# Altium footprint library communication_modules.PcbLib: 12 footprints
Each footprint in its own frame and in the unit in brackets; x right, y up, seen from the top. Pads: shape width x height; smd on the part's side, far side on the other; paste and mask are expansions set on the pad; w line width, h text height; cw(c..) or ccw(c..) is an arc to the next point about the centre after c.
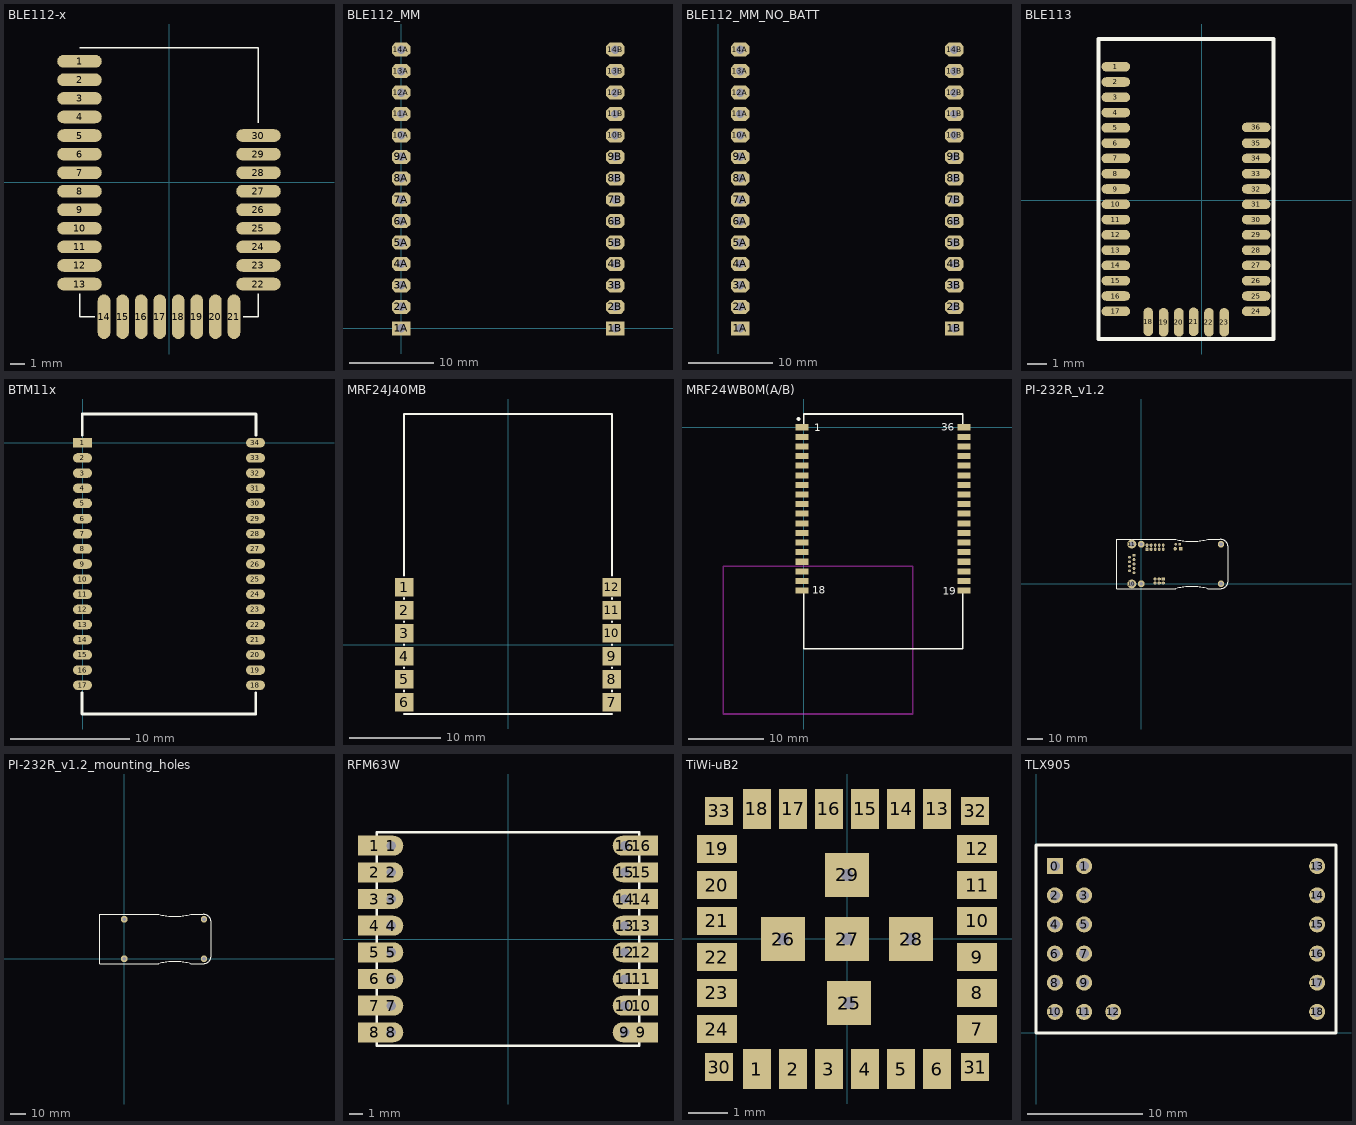
[diagram p0: the footprints below, top view; thin cyan lines are the x and y axes]

## BLE112-x [mm] "Bluegiga BLE112 Bluetooth Low Energy Single Mode Module"
height 2.3
pads (30):
  oval 3x0.85 smd mask+0.05: 1(-6.025,8.15) 2(-6.025,6.9) 3(-6.025,5.65) 4(-6.025,4.4) 5(-6.025,3.15) 6(-6.025,1.9) 7(-6.025,0.65) 8(-6.025,-0.6) 9(-6.025,-1.85) 10(-6.025,-3.1) 11(-6.025,-4.35) 12(-6.025,-5.6) 13(-6.025,-6.85) 22(6.025,-6.85) 23(6.025,-5.6) 24(6.025,-4.35) 25(6.025,-3.1) 26(6.025,-1.85) 27(6.025,-0.6) 28(6.025,0.65) 29(6.025,1.9) 30(6.025,3.15)
  oval 0.85x3 smd mask+0.05: 14(-4.375,-9.05) 15(-3.125,-9.05) 16(-1.875,-9.05) 17(-0.625,-9.05) 18(0.625,-9.05) 19(1.875,-9.05) 20(3.125,-9.05) 21(4.375,-9.05)
Top Overlay:
  lines w0.1: -6.025,-7.5 -6.025,-9.05 -5,-9.05 ; -6.025,9.05 6.025,9.05 6.025,4 ; 5,-9.05 6.025,-9.05 6.025,-7.5
3D body "User Library-BLE112.step": height 2.3, standoff 0, extent -6.025,-9.05 6.025,9.05

## BLE112_MM [mm]
pads (28):
  rect 2.2x1.66 hole 1: 1A(0,0) 1B(25.4,0)
  oct 2.2x1.66 hole 1: 2A(0,2.54) 2B(25.4,2.54) 3A(0,5.08) 3B(25.4,5.08) 4A(0,7.62) 4B(25.4,7.62) 5A(0,10.16) 5B(25.4,10.16) 6A(0,12.7) 6B(25.4,12.7) 7A(0,15.24) 7B(25.4,15.24) 8A(0,17.78) 8B(25.4,17.78) 9A(0,20.32) 9B(25.4,20.32) 10A(0,22.86) 10B(25.4,22.86) 11A(0,25.4) 11B(25.4,25.4) 12A(0,27.94) 12B(25.4,27.94) 13A(0,30.48) 13B(25.4,30.48) 14A(0,33.02) 14B(25.4,33.02)
Bottom Overlay:
  lines w0.254: -1.27,1.27 1.2,1.27 ; 24.13,1.27 26.6,1.27 ; -1.27,-1.27 -1.27,34.29 1.2,34.29 1.2,-1.27 -1.27,-1.27 ; 24.13,-1.27 24.13,34.29 26.6,34.29 26.6,-1.27 24.13,-1.27
3D body "BLE112_Module.step": height 12, standoff -1.79, extent -2.61,-3.182 27.87,35.56

## BLE112_MM_NO_BATT [mm]
pads (28):
  rect 2.2x1.66 hole 1: 1A(2.6,3.175) 1B(28,3.175)
  oct 2.2x1.66 hole 1: 2A(2.6,5.715) 2B(28,5.715) 3A(2.6,8.255) 3B(28,8.255) 4A(2.6,10.795) 4B(28,10.795) 5A(2.6,13.335) 5B(28,13.335) 6A(2.6,15.875) 6B(28,15.875) 7A(2.6,18.415) 7B(28,18.415) 8A(2.6,20.955) 8B(28,20.955) 9A(2.6,23.495) 9B(28,23.495) 10A(2.6,26.035) 10B(28,26.035) 11A(2.6,28.575) 11B(28,28.575) 12A(2.6,31.115) 12B(28,31.115) 13A(2.6,33.655) 13B(28,33.655) 14A(2.6,36.195) 14B(28,36.195)
Bottom Overlay:
  lines w0.254: 1.33,4.445 3.8,4.445 ; 26.73,4.445 29.2,4.445 ; 1.33,1.905 3.8,1.905 3.8,37.465 1.33,37.465 1.33,1.905 ; 26.73,1.905 29.2,1.905 29.2,37.465 26.73,37.465 26.73,1.905
3D body "BLE112_Module(No Battery).step": height 12, standoff -1.79, extent 0,0 30.48,38.742

## BLE113 [mm]
pads (36):
  oval 1.5x0.5 smd: 1(-4.5,7) 2(-4.5,6.2) 3(-4.5,5.4) 4(-4.5,4.6) 5(-4.5,3.8) 6(-4.5,3) 7(-4.5,2.2) 8(-4.5,1.4) 9(-4.5,0.6) 10(-4.5,-0.2) 11(-4.5,-1) 12(-4.5,-1.8) 13(-4.5,-2.6) 14(-4.5,-3.4) 15(-4.5,-4.2) 16(-4.5,-5) 17(-4.5,-5.8) 24(2.85,-5.8) 25(2.85,-5) 26(2.85,-4.2) 27(2.85,-3.4) 28(2.85,-2.6) 29(2.85,-1.8) 30(2.85,-1) 31(2.85,-0.2) 32(2.85,0.6) 33(2.85,1.4) 34(2.85,2.2) 35(2.85,3) 36(2.85,3.825)
  oval 0.5x1.5 smd: 18(-2.8,-6.35) 19(-2,-6.375) 20(-1.2,-6.375) 21(-0.425,-6.35) 22(0.375,-6.375) 23(1.175,-6.375)
Top Overlay:
  lines w0.2: -5.4,-7.25 -5.4,8.45 3.75,8.45 3.75,-7.25 -5.4,-7.25
3D body "User Library-BLE113.step": height 1.9, standoff -0.01, extent -5.4,-7.263 3.75,8.462

## BTM11x [mm] "Bluetooth Class 2 BC04-ext Module"
height 2.2
pads (34):
  rect 1.6x0.8 smd: 1(0,0)
  oval 1.6x0.8 smd: 2(0,-1.27) 3(0,-2.54) 4(0,-3.81) 5(0,-5.08) 6(0,-6.35) 7(0,-7.62) 8(0,-8.89) 9(0,-10.16) 10(0,-11.43) 11(0,-12.7) 12(0,-13.97) 13(0,-15.24) 14(0,-16.51) 15(0,-17.78) 16(0,-19.05) 17(0,-20.32) 18(14.5,-20.32) 19(14.5,-19.05) 20(14.5,-17.78) 21(14.5,-16.51) 22(14.5,-15.24) 23(14.5,-13.97) 24(14.5,-12.7) 25(14.5,-11.43) 26(14.5,-10.16) 27(14.5,-8.89) 28(14.5,-7.62) 29(14.5,-6.35) 30(14.5,-5.08) 31(14.5,-3.81) 32(14.5,-2.54) 33(14.5,-1.27) 34(14.5,0)
Top Overlay:
  lines w0.229: -0.051,-20.955 -0.051,-22.733 14.529,-22.733 14.529,-20.955 ; -0.029,0.635 -0.029,2.413 14.551,2.413 14.551,0.635
3D body: height 2.2, standoff 0, extent 0,-22.682 14.478,2.337

## MRF24J40MB [mil]
pads (12):
  rect 80x80 smd: 1(-450,250) 2(-450,150) 3(-450,50) 4(-450,-50) 5(-450,-150) 6(-450,-250) 7(450,-250) 8(450,-150) 9(450,-50) 10(450,50) 11(450,150) 12(450,250)
Top Overlay:
  lines w7.87: -450,-300 450,-300 ; -450,-202 -450,-198 ; -450,-102 -450,-98 ; -450,-2 -450,2 ; -450,98 -450,102 ; -450,198 -450,202 ; -450,300 -450,1000 450,1000 450,300 ; 450,-202 450,-198 ; 450,-102 450,-98 ; 450,-2 450,2 ; 450,98 450,102 ; 450,198 450,202
3D body "User Library-MRF24J40MB-1.STEP": height 132.39, standoff -0.04, extent -449.99,-300 450.01,1000

## MRF24WB0M(A/B) [mm]
pads (36):
  rect 1.7x0.8 smd: 1(-0.2,0) 2(-0.2,-1.27) 3(-0.2,-2.54) 4(-0.2,-3.81) 5(-0.2,-5.08) 6(-0.2,-6.35) 7(-0.2,-7.62) 8(-0.2,-8.89) 9(-0.2,-10.16) 10(-0.2,-11.43) 11(-0.2,-12.7) 12(-0.2,-13.97) 13(-0.2,-15.24) 14(-0.2,-16.51) 15(-0.2,-17.78) 16(-0.2,-19.05) 17(-0.2,-20.32) 18(-0.2,-21.59) 19(21.2,-21.59) 20(21.2,-20.32) 21(21.2,-19.05) 22(21.2,-17.78) 23(21.2,-16.51) 24(21.2,-15.24) 25(21.2,-13.97) 26(21.2,-12.7) 27(21.2,-11.43) 28(21.2,-10.16) 29(21.2,-8.89) 30(21.2,-7.62) 31(21.2,-6.35) 32(21.2,-5.08) 33(21.2,-3.81) 34(21.2,-2.54) 35(21.2,-1.27) 36(21.2,0)
Top Overlay:
  circle w0.254: c-0.675,1.1 r0.127
  lines w0.2: 0,-21.59 0,-29.3 21,-29.3 21,-21.59 ; 0,0 0,1.75 21,1.75 21,0
  text "1" at 1.375,-0.5 h1
  text "18" at 1.15,-22.025 h1
  text "19" at 18.375,-22.125 h1
  text "36" at 18.2,-0.475 h1
Keep-Out Layer:
  lines w0.2: -10.6,-37.9 -10.6,-18.4 14.4,-18.4 14.4,-37.9 -10.6,-37.9
3D body: height 2.7, standoff 1, extent 1.1,-23.95 19.7,0.75
3D body: height 1, standoff 0, extent 0,-29.275 21,1.75
3D body: height 2.27, standoff 1, extent 15.616,-28.596 19.6,-24.604

## PI-232R_v1.2 [mm]
pads (35):
  rect 2x1.7 hole 1: 1(-4.58,18.04)
  oct 4x4 hole 2.2: 1(0,0) 1(0,25) 1(50,0) 1(50,25)
  rect 1.7x2 hole 1: 1(3.55,21.765)
  rect 2x2 hole 1: 1(13.71,3.02)
  rect 1.651x1.651 hole 1: 1(24.2,24.9)
  rect 2.1x2.1 hole 1.1: 1(24.7,22.1)
  oct 2x1.7 hole 1: 2(-4.58,15.27) 3(-4.58,12.5) 4(-4.58,9.73) 5(-4.58,6.96) 6(-7.42,16.655) 7(-7.42,13.885) 8(-7.42,11.115) 9(-7.42,8.345)
  oct 1.7x2 hole 1: 2(3.55,24.305) 3(6.09,21.765) 4(6.09,24.305) 5(8.63,21.765) 6(8.63,24.305) 7(11.17,21.765) 8(11.17,24.305) 9(13.71,21.765) 10(13.71,24.305)
  oct 2x2 hole 1: 2(13.71,0.48) 3(11.17,3.02) 4(11.17,0.48) 5(8.63,3.02) 6(8.63,0.48)
  oct 2.1x2.1 hole 1.1: 2(21.2,22.1)
  oct 1.651x1.651 hole 1: 2(21.66,24.9)
  round 5.6 hole 3.2: 10(-6,0.005) 11(-6,24.995)
Top Layer:
  lines w0.4: 21.2,24.44 21.66,24.9
Bottom Layer:
  lines w0.4: 3.55,21.765 3.55,22.25 ; 6.09,23.59 6.09,24.305 ; 8.63,24.305 8.63,24.43
  lines w0.8: -6,0.005 -5.995,0 ; -6,24.995 -5.995,25
Top Overlay:
  lines w0.2: -15.5,-3 -15.5,28 21.439,28 ccw(c31.54,66.703) 41.645,28 49.5,28 cw(c49.5,23) 54.5,23 54.5,1.999 cw(c49.5,1.999) 49.5,-3.001 41.644,-3.001 ccw(c31.54,-41.704) 21.439,-3 -15.5,-3
3D body "USBtoRS232.step": height 17.57, standoff 1.5, extent -22.231,-3.001 69.251,28.019

## PI-232R_v1.2_mounting_holes [mm]
pads (4):
  oct 4x4 hole 2.2: 1(0,0) 1(0,25) 1(50,0) 1(50,25)
Top Overlay:
  lines w0.2: -15.5,-3 21.439,-3 cw(c31.54,-41.704) 41.644,-3.001 49.5,-3.001 ccw(c49.5,1.999) 54.5,1.999 54.5,23 ccw(c49.5,23) 49.5,28 41.645,28 cw(c31.54,66.703) 21.439,27.999 -15.5,28 -15.5,-3
3D body "USBtoRS232.step": height 17.57, standoff 1.5, extent -22.231,-3.001 69.251,28.019

## RFM63W [mm] "RFM63W ISM Transciver Module"
height 1.9
pads (32):
  rect 2.5x1.5 smd: 1(-10,7) 2(-10,5) 3(-10,3) 4(-10,1) 5(-10,-1) 6(-10,-3) 7(-10,-5) 8(-10,-7) 9(10,-7) 10(10,-5) 11(10,-3) 12(10,-1) 13(10,1) 14(10,3) 15(10,5) 16(10,7)
  oval 1.8x1.5 hole 0.7: 1(-8.75,7) 2(-8.75,5) 3(-8.75,3) 4(-8.75,1) 5(-8.75,-1) 6(-8.75,-3) 7(-8.75,-5) 8(-8.75,-7) 9(8.75,-7) 10(8.75,-5) 11(8.75,-3) 12(8.75,-1) 13(8.75,1) 14(8.75,3) 15(8.75,5) 16(8.75,7)
Top Overlay:
  lines w0.2: -9.85,-8 9.85,-8 9.85,8 -9.85,8 -9.85,-8

## TiWi-uB2 [mm] "TiWi - uB2 Bluetooth Module"
height 1.5
pads (33):
  rect 0.7x1 smd: 1(-2.25,-3.25) 2(-1.35,-3.25) 3(-0.45,-3.25) 4(0.45,-3.25) 5(1.35,-3.25) 6(2.25,-3.25) 13(2.25,3.25) 14(1.35,3.25) 15(0.45,3.25) 16(-0.45,3.25) 17(-1.35,3.25) 18(-2.25,3.25)
  rect 1x0.7 smd: 7(3.25,-2.25) 8(3.25,-1.35) 9(3.25,-0.45) 10(3.25,0.45) 11(3.25,1.35) 12(3.25,2.25) 19(-3.25,2.25) 20(-3.25,1.35) 21(-3.25,0.45) 22(-3.25,-0.45) 23(-3.25,-1.35) 24(-3.25,-2.25)
  rect 1.1x1.1 hole 0.3: 25(0.05,-1.6) 26(-1.6,0) 27(0,0) 28(1.6,0) 29(0,1.6)
  rect 0.7x0.7 smd: 30(-3.2,-3.2) 31(3.2,-3.2) 32(3.2,3.2) 33(-3.2,3.2)
3D body: height 1.5, standoff 0, extent -3.5,-3.5 3.5,3.5

## TLX905 [mil]
height 393.7
pads (19):
  rect 55x55 hole 34.37: 0(64.96,572.44)
  round 55 hole 34.37: 1(164.96,572.44) 2(64.96,472.44) 3(164.96,472.44) 4(64.96,372.44) 5(164.96,372.44) 6(64.96,272.44) 7(164.96,272.44) 8(64.96,172.44) 9(164.96,172.44) 10(64.96,72.44) 11(164.96,72.44) 12(264.96,72.44) 13(964.96,572.44) 14(964.96,472.44) 15(964.96,372.44) 16(964.96,272.44) 17(964.96,172.44) 18(964.96,72.44)
Top Overlay:
  lines w9: 0,0 1029.53,0 1029.53,644.88 0,644.88 0,0
3D body: height 110.24, standoff 0, extent 0,0 307.09,645.67
3D body: height 110.24, standoff 0, extent 915.35,0 1029.53,647.64